# Altium footprint library PcbLib1.PcbLib: 120 footprints (part 1 of 8)
Each footprint in its own frame and in the unit in brackets; x right, y up, seen from the top. Pads: shape width x height; smd on the part's side, far side on the other; paste and mask are expansions set on the pad; w line width, h text height; cw(c..) or ccw(c..) is an arc to the next point about the centre after c.
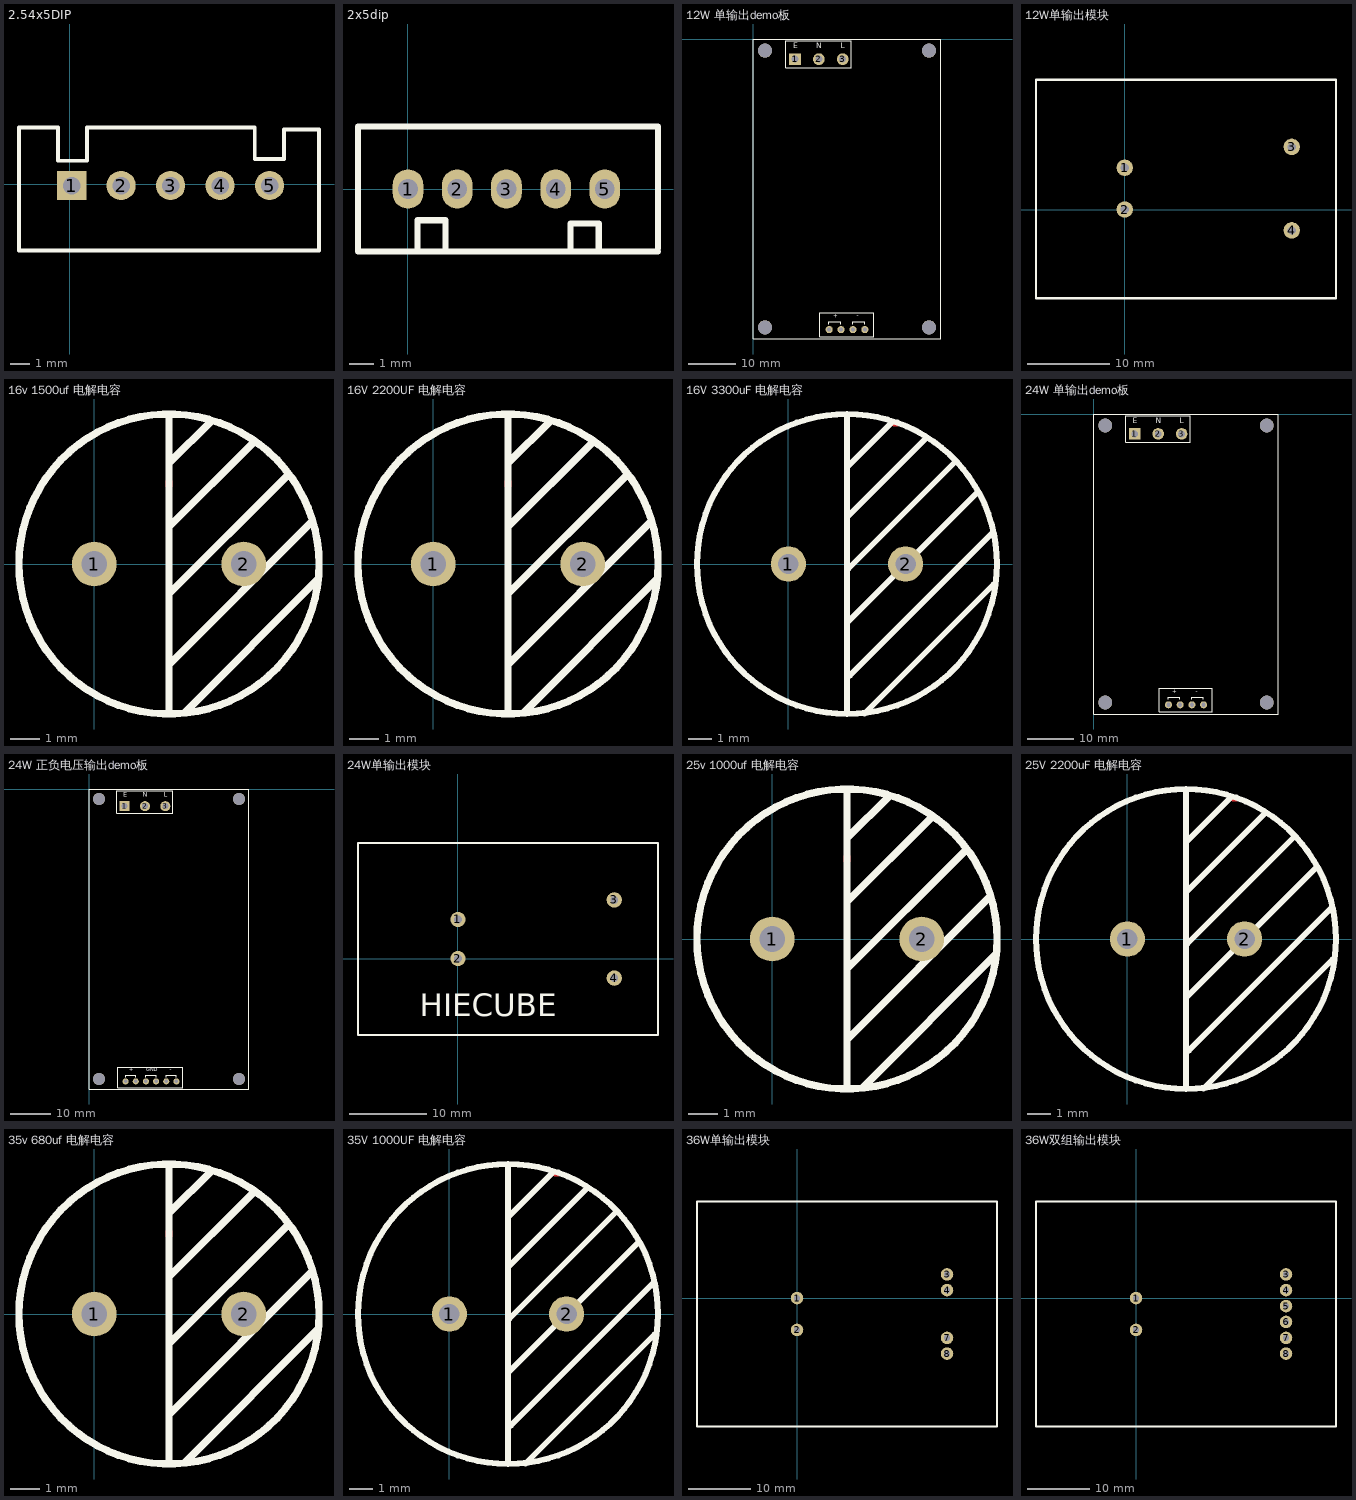
[diagram p0: the footprints below, top view; thin cyan lines are the x and y axes]

## 2.54x5DIP [mm]
pads (5):
  rect 1.5x1.5 hole 0.9: 1(0.103,-0.073)
  round 1.5 hole 0.9: 2(2.643,-0.073) 3(5.183,-0.073) 4(7.723,-0.073) 5(10.263,-0.073)
Top Overlay:
  lines w0.2: -2.6,2.8 -2.6,-3.4 12.7,-3.4 ; -2.6,2.9 -0.7,2.9 ; -0.6,2.9 -0.6,1.2 0.9,1.2 0.9,2.9 9.5,2.9 9.5,1.3 11,1.3 11,2.8 12.8,2.8 12.8,-3.4

## 2x5dip [mm]
pads (5):
  oval 1.25x1.6 hole 0.8: 1(0,0) 2(2,0) 3(4,0) 4(6,0) 5(8,0)
Top Overlay:
  lines w0.01: -0.353,0.403 -0.353,0.223 ; 0.147,0.403 0.147,0.223 ; 1.647,0.403 1.647,0.223 ; 2.147,0.403 2.147,0.223 ; 3.647,0.403 3.647,0.223 ; 4.147,0.403 4.147,0.223 ; 5.647,0.403 5.647,0.223 ; 6.147,0.403 6.147,0.223 ; 7.647,0.403 7.647,0.223 ; 8.147,0.403 8.147,0.223 ; -0.353,-0.277 0.147,-0.277 ; -0.353,-0.277 -0.203,-0.127 ; -0.353,-0.277 -0.353,0.223 ; -0.353,0.223 0.147,0.223 ; -0.353,0.223 -0.203,0.073 ; -0.203,-0.127 0.147,0.223 ; -0.203,-0.127 -0.203,0.073 ; -0.203,-0.127 -0.003,-0.127 -0.003,0.073 -0.203,0.073 ; -0.203,0.073 0.147,-0.277 ; 0.147,-0.277 0.147,0.223 ; 1.647,-0.277 2.147,-0.277 ; 1.647,-0.277 1.797,-0.127 ; 1.647,-0.277 1.647,0.223 ; 1.647,0.223 2.147,0.223 ; 1.647,0.223 1.797,0.073 ; 1.797,-0.127 1.797,0.073 ; 1.797,-0.127 1.997,-0.127 ; 1.797,0.073 1.997,0.073 ; 1.997,-0.127 1.997,0.073 ; 1.997,-0.127 2.147,-0.277 ; 1.997,0.073 2.147,0.223 ; 2.147,-0.277 2.147,0.223 ; 3.647,-0.277 4.147,-0.277 ; 3.647,-0.277 3.797,-0.127 ; 3.647,-0.277 3.647,0.223 ; 3.647,0.223 4.147,0.223 ; 3.647,0.223 3.797,0.073 ; 3.797,-0.127 3.797,0.073 ; 3.797,-0.127 3.997,-0.127 ; 3.797,0.073 3.997,0.073 ; 3.997,-0.127 3.997,0.073 ; 3.997,-0.127 4.147,-0.277 ; 3.997,0.073 4.147,0.223 ; 4.147,-0.277 4.147,0.223 ; 5.647,-0.277 6.147,-0.277 ; 5.647,-0.277 5.797,-0.127 ; 5.647,-0.277 5.647,0.223 ; 5.647,0.223 6.147,0.223 ; 5.647,0.223 5.797,0.073 ; 5.797,-0.127 5.797,0.073 ; 5.797,-0.127 5.997,-0.127 ; 5.797,0.073 5.997,0.073 ; 5.997,-0.127 5.997,0.073 ; 5.997,-0.127 6.147,-0.277 ; 5.997,0.073 6.147,0.223 ; 6.147,-0.277 6.147,0.223 ; 7.647,-0.277 8.147,-0.277 ; 7.647,-0.277 7.797,-0.127 ; 7.647,-0.277 7.647,0.223 ; 7.647,0.223 8.147,0.223 ; 7.647,0.223 7.797,0.073 ; 7.797,-0.127 7.797,0.073 ; 7.797,-0.127 7.997,-0.127 ; 7.797,0.073 7.997,0.073 ; 7.997,-0.127 7.997,0.073 ; 7.997,-0.127 8.147,-0.277 ; 7.997,0.073 8.147,0.223 ; 8.147,-0.277 8.147,0.223
  lines w0.254: -2.032,-2.54 10.16,-2.54 ; -2.032,-2.46 -2.032,2.54 10.16,2.54 10.16,-2.413 ; 0.381,-2.413 0.381,-1.27 1.524,-1.27 1.524,-2.413 ; 6.604,-2.54 6.604,-1.397 7.747,-1.397 7.747,-2.54

## 12W 单输出demo板 [mm]
pads (11):
  rect 2.5x2.5 hole 1.5: 1(8.92,-4.3)
  round 2.5 hole 1.5: 2(14,-4.3) 3(19.08,-4.3)
  round 1.524 hole 0.88: 4(16.19,-62) 5(18.73,-62) 6(21.27,-62) 7(23.81,-62)
  round 3 hole 3: ""(2.5,-61.5) ""(2.5,-2.5) ""(37.5,-61.5) ""(37.5,-2.5)
Top Overlay:
  lines w0.254: 16.129,-60.833 16.129,-60.325 18.669,-60.325 18.669,-60.833 ; 21.209,-60.833 21.209,-60.325 23.749,-60.325 23.749,-60.833 ; 0,-64 0,0 40,0 40,-64 0,-64 ; 6.985,-6.096 6.985,-0.381 20.955,-0.381 20.955,-6.096 6.985,-6.096 ; 14.224,-63.5 25.654,-63.5 25.654,-58.42 14.224,-58.42 14.224,-63.5
  text "N" at 13.462,-2.413 h2
  text "L" at 18.669,-2.413 h2
  text "E" at 8.509,-2.413 h2
  text "-" at 22.098,-59.817 h1.52
  text "+" at 17.018,-59.817 h1.52

## 12W单输出模块 [mm]
pads (4):
  round 2 hole 1: 1(0,5.08) 2(0,0) 3(20.32,7.62) 4(20.32,-2.54)
Top Overlay:
  lines w0.254: -10.8,-10.8 25.7,-10.8 ; -10.8,-10.71 -10.8,15.79 ; -10.795,15.79 25.7,15.79 25.7,-10.71

## 16v 1500uf 电解电容 [mil]
pads (2):
  round 60 hole 34.65: 1(0,0) 2(200,0)
Top Layer:
  lines w10: 100,105 100,110
Top Overlay:
  circle w10: c100,0 r200.79
  lines w10: 100,-200 100,200 ; 100,-135 290,55 ; 100,-40 257.5,117.5 ; 100,50 212.5,162.5 ; 102.5,137.5 155,190 ; 122.5,-197.5 300,-20

## 16V 2200UF 电解电容 [mil]
pads (2):
  round 60 hole 34.65: 1(0,0) 2(200,0)
Top Layer:
  lines w10: 100,105 100,110
Top Overlay:
  circle w10: c100,0 r200.79
  lines w10: 100,-200 100,200 ; 100,-135 290,55 ; 100,-40 257.5,117.5 ; 100,50 212.5,162.5 ; 102.5,137.5 155,190 ; 122.5,-197.5 300,-20

## 16V 3300uF 电解电容 [mil]
pads (2):
  round 60 hole 34.65: 1(0,0) 2(200,0)
Top Layer:
  lines w10: 100,105 100,110 ; 182.5,240 180,240 185,240
Top Overlay:
  circle w10: c100,0 r255.91
  lines w10: 100,-250 100,255 ; 100,-100 322.5,122.5 ; 100,80 235,215 ; 100,165 177.5,242.5 ; 102.5,-7.5 285,175 ; 105,-190 347.5,52.5 ; 130,-255 350,-35

## 24W 单输出demo板 [mm]
pads (11):
  rect 2.5x2.5 hole 1.5: 1(8.9,-4.3)
  round 2.5 hole 1.5: 2(13.98,-4.3) 3(19.06,-4.3)
  round 1.524 hole 0.88: 4(16.2,-63) 5(18.74,-63) 6(21.28,-63) 7(23.82,-63)
  round 3 hole 3: ""(2.5,-62.5) ""(2.5,-2.5) ""(37.5,-62.5) ""(37.5,-2.5)
Top Overlay:
  lines w0.254: 16.129,-61.849 16.129,-61.341 18.669,-61.341 18.669,-61.849 ; 21.209,-61.849 21.209,-61.341 23.749,-61.341 23.749,-61.849 ; 0,-65 0,0 40,0 40,-65 0,-65 ; 6.985,-6.096 6.985,-0.381 20.955,-0.381 20.955,-6.096 6.985,-6.096 ; 14.224,-64.516 25.654,-64.516 25.654,-59.436 14.224,-59.436 14.224,-64.516
  text "N" at 13.462,-2.413 h2
  text "L" at 18.669,-2.413 h2
  text "E" at 8.509,-2.413 h2
  text "-" at 22.098,-60.833 h1.52
  text "+" at 17.018,-60.833 h1.52

## 24W 正负电压输出demo板 [mm]
pads (13):
  rect 2.5x2.5 hole 1.5: 1(8.92,-4.3)
  round 2.5 hole 1.5: 2(14,-4.3) 3(19.08,-4.3)
  round 1.524 hole 0.88: 4(9.15,-73.1) 4(11.69,-73.1) 5(14.23,-73.1) 5(16.77,-73.1) 6(19.31,-73.1) 6(21.85,-73.1)
  round 3 hole 3: ""(2.5,-72.5) ""(2.5,-2.5) ""(37.5,-72.5) ""(37.5,-2.5)
Top Overlay:
  lines w0.254: 9.144,-72.009 9.144,-71.501 11.684,-71.501 11.684,-72.009 ; 14.224,-72.009 14.224,-71.501 16.764,-71.501 16.764,-72.009 ; 19.304,-72.009 19.304,-71.501 21.844,-71.501 21.844,-72.009 ; 0,-75 40,-75 40,0 0,0 0,-75 ; 6.985,-6.096 20.955,-6.096 20.955,-0.381 6.985,-0.381 6.985,-6.096 ; 7.239,-74.676 7.239,-69.596 23.495,-69.596 23.495,-74.676 7.239,-74.676
  text "+" at 10.033,-70.993 h1.52
  text "-" at 20.193,-70.993 h1.52
  text "GND" at 14.351,-70.993 h1.52
  text "E" at 8.509,-2.413 h2
  text "L" at 18.669,-2.413 h2
  text "N" at 13.462,-2.413 h2

## 24W单输出模块 [mm]
pads (4):
  round 2 hole 1: 1(0,5.08) 2(0,0) 3(20.32,7.62) 4(20.32,-2.54)
Top Overlay:
  lines w0.254: -13,-9.96 -13,15.04 26,15.04 26,-9.96 -13,-9.96
  text "HIECUBE" at -4.953,-8.509 h5

## 25v 1000uf 电解电容 [mil]
pads (2):
  round 60 hole 34.65: 1(0,0) 2(200,0)
Top Layer:
  lines w10: 100,105 100,110
Top Overlay:
  circle w10: c100,0 r200.79
  lines w10: 100,-200 100,200 ; 100,-135 290,55 ; 100,-40 257.5,117.5 ; 100,50 212.5,162.5 ; 102.5,137.5 155,190 ; 122.5,-197.5 300,-20

## 25V 2200uF 电解电容 [mil]
pads (2):
  round 60 hole 34.65: 1(0,0) 2(200,0)
Top Layer:
  lines w10: 100,105 100,110 ; 182.5,240 180,240 185,240
Top Overlay:
  circle w10: c100,0 r255.91
  lines w10: 100,-250 100,255 ; 100,-100 322.5,122.5 ; 100,80 235,215 ; 100,165 177.5,242.5 ; 102.5,-7.5 285,175 ; 105,-190 347.5,52.5 ; 130,-255 350,-35

## 35v 680uf 电解电容 [mil]
pads (2):
  round 60 hole 34.65: 1(0,0) 2(200,0)
Top Layer:
  lines w10: 100,105 100,110
Top Overlay:
  circle w10: c100,0 r200.79
  lines w10: 100,-200 100,200 ; 100,-135 290,55 ; 100,-40 257.5,117.5 ; 100,50 212.5,162.5 ; 102.5,137.5 155,190 ; 122.5,-197.5 300,-20

## 35V 1000UF 电解电容 [mil]
pads (2):
  round 60 hole 34.65: 1(0,0) 2(200,0)
Top Layer:
  lines w10: 100,105 100,110 ; 182.5,240 180,240 185,240
Top Overlay:
  circle w10: c100,0 r255.91
  lines w10: 100,-250 100,255 ; 100,-100 322.5,122.5 ; 100,80 235,215 ; 100,165 177.5,242.5 ; 102.5,-7.5 285,175 ; 105,-190 347.5,52.5 ; 130,-255 350,-35

## 36W单输出模块 [mm]
pads (6):
  round 2 hole 1: 1(0,0) 2(0,-5.08) 3(24,3.81) 4(24,1.27) 7(24,-6.35) 8(24,-8.89)
Top Overlay:
  lines w0.254: -16,-20.54 32,-20.54 32,15.46 -16,15.46 -16,-20.54

## 36W双组输出模块 [mm]
pads (8):
  round 2 hole 1: 1(0,0) 2(0,-5.08) 3(24,3.81) 4(24,1.27) 5(24,-1.27) 6(24,-3.81) 7(24,-6.35) 8(24,-8.89)
Top Overlay:
  lines w0.254: -16,-20.54 -16,15.46 32,15.46 32,-20.54 -16,-20.54